# Altium footprint library Sajad_Altium_Library.PcbLib: 380 footprints (part 17 of 24)
Each footprint in its own frame and in the unit in brackets; x right, y up, seen from the top. Pads: shape width x height; smd on the part's side, far side on the other; paste and mask are expansions set on the pad; w line width, h text height; cw(c..) or ccw(c..) is an arc to the next point about the centre after c.
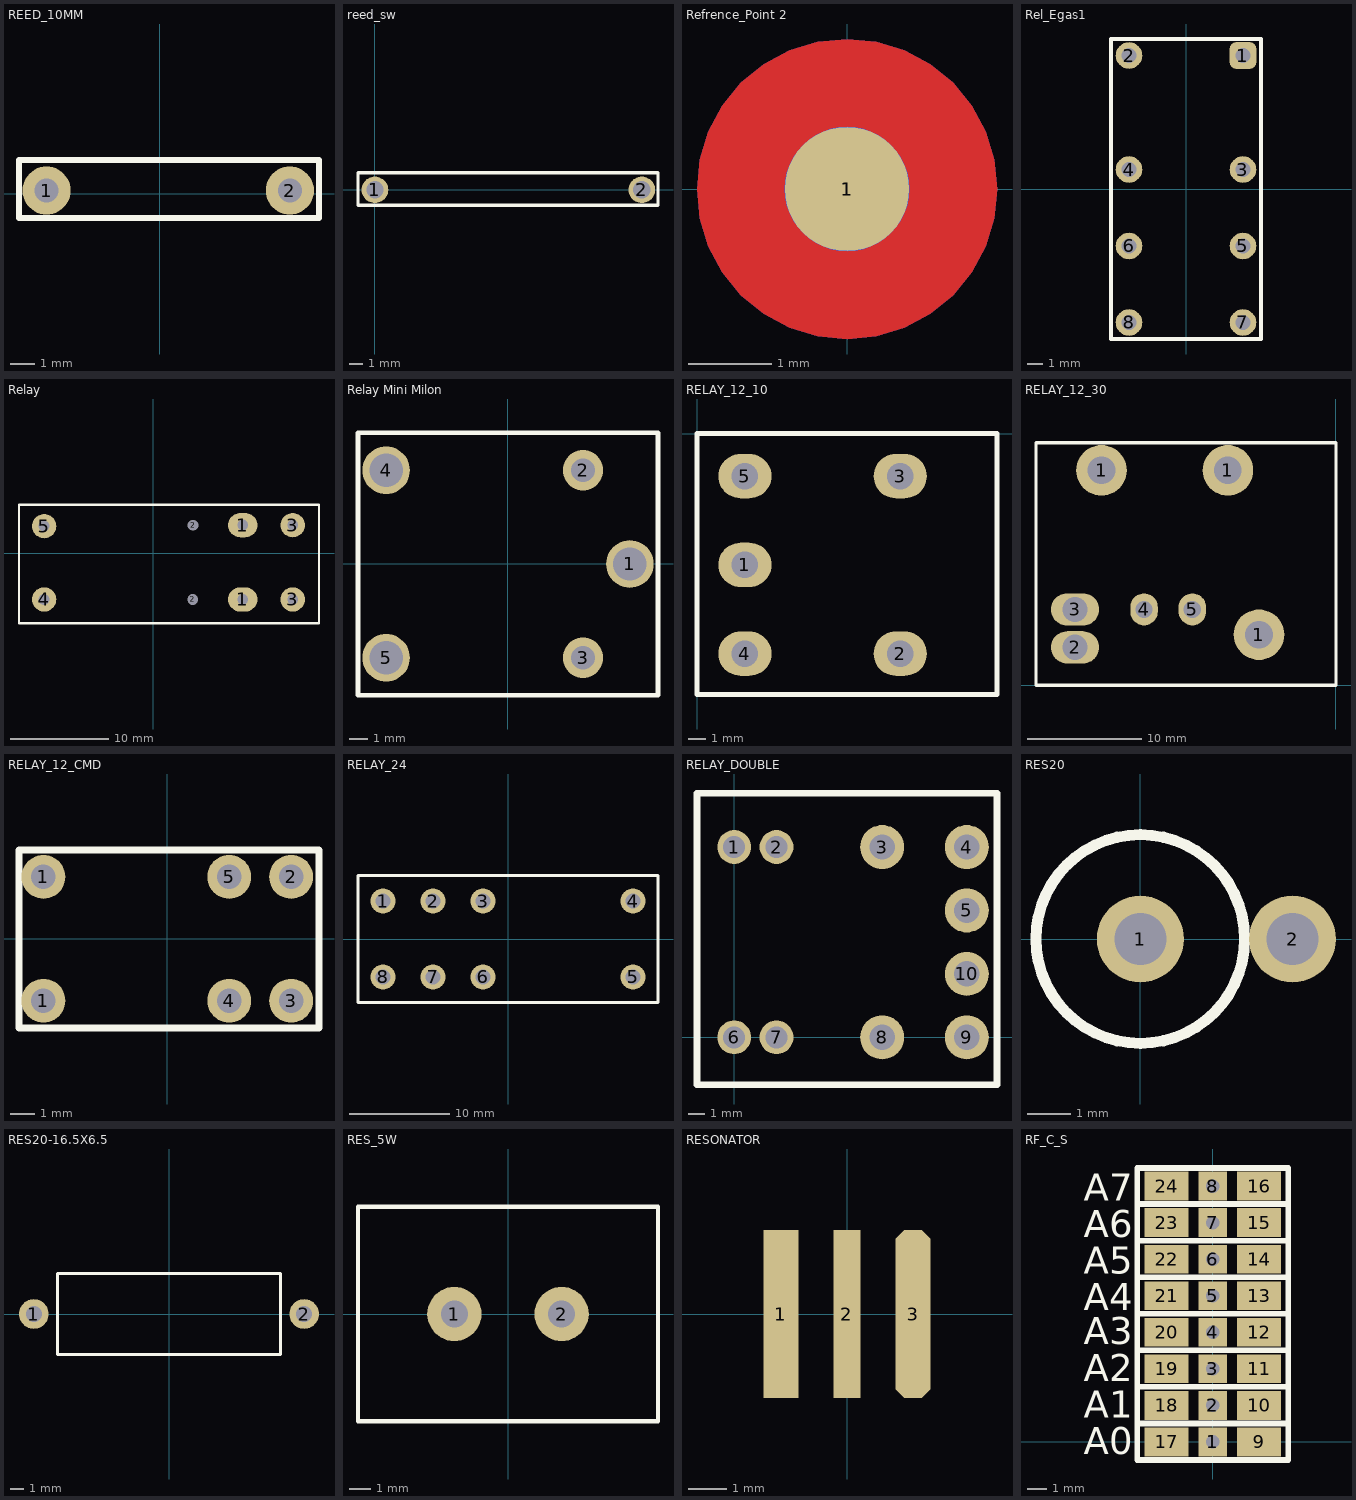
[diagram p16: the footprints below, top view; thin cyan lines are the x and y axes]

## REED_10MM [mm]
pads (2):
  round 2 hole 1: 1(-4.699,0.127) 2(5.395,0.127)
Top Overlay:
  lines w0.25: -5.842,-1.016 6.604,-1.016 6.604,1.397 -5.842,1.397 -5.842,-1.016

## reed_sw [mm]
pads (2):
  round 2 hole 1.3: 1(0,0) 2(20,0)
Top Overlay:
  lines w0.25: -1.27,-1.143 -1.27,1.27 21.209,1.27 21.209,-1.143 -1.27,-1.143

## Refrence_Point 2 [mm] "Refrence Point for Assembling Pcb"
pads (2):
  round 1.5 smd mask+1: 1(0,0)
  round 1.5 smd far side mask+1: 1(0,0)
Top Layer:
  pour cut-out: -1.809,0 -1.774,-0.353 -1.671,-0.692 -1.504,-1.005 -1.279,-1.279 -1.005,-1.504 -0.692,-1.671 -0.353,-1.774 0,-1.809 0.353,-1.774 0.692,-1.671 1.005,-1.504 1.279,-1.279 1.504,-1.005 1.671,-0.692 1.774,-0.353 1.809,0 1.774,0.353 1.671,0.692 1.504,1.005 1.279,1.279 1.005,1.504 0.692,1.671 0.353,1.774 0,1.809 -0.353,1.774 -0.692,1.671 -1.005,1.504 -1.279,1.279 -1.504,1.005 -1.671,0.692 -1.774,0.353
Bottom Layer:
  pour cut-out: -1.809,0 -1.774,-0.353 -1.671,-0.692 -1.504,-1.005 -1.279,-1.279 -1.005,-1.504 -0.692,-1.671 -0.353,-1.774 0,-1.809 0.353,-1.774 0.692,-1.671 1.005,-1.504 1.279,-1.279 1.504,-1.005 1.671,-0.692 1.774,-0.353 1.809,0 1.774,0.353 1.671,0.692 1.504,1.005 1.279,1.279 1.005,1.504 0.692,1.671 0.353,1.774 0,1.809 -0.353,1.774 -0.692,1.671 -1.005,1.504 -1.279,1.279 -1.504,1.005 -1.671,0.692 -1.774,0.353

## Rel_Egas1 [mil]
pads (8):
  rrect50% 70x70 hole 40: 1(149.61,350.39)
  round 70 hole 40: 2(-149.61,350.39) 3(149.61,51.18) 4(-149.61,51.18) 5(149.61,-149.61) 6(-149.61,-149.61) 7(149.61,-350.39) 8(-149.61,-350.39)
Top Overlay:
  lines w10: -196.85,-393.7 196.85,-393.7 196.85,393.7 -196.85,393.7 -196.85,-393.7

## Relay [mm]
pads (8):
  oval 3x2.5 hole 1.1: 1(9.124,-4.706) 1(9.124,2.894)
  round 1 hole 1.1: 2(4.024,-4.706) 2(4.048,2.886)
  round 2.5 hole 1.1: 3(14.224,-4.706) 3(14.224,2.894) 4(-11.176,-4.706) 5(-11.176,2.794)
Top Overlay:
  lines w0.254: -13.743,-7.112 -13.743,4.951 -13.741,4.953 16.916,4.953 16.916,-7.112 -13.743,-7.112

## Relay Mini Milon [mm]
pads (5):
  round 2.54 hole 1.778: 1(6.5,0) 4(-6.5,5) 5(-6.5,-5)
  round 2.159 hole 1.27: 2(4,5) 3(4,-5)
Top Overlay:
  lines w0.254: -8,-7 8,-7 8,7 -8,7 -8,-7

## RELAY_12_10 [mm] "RELAY_12_10"
pads (5):
  oval 3x2.5 hole 1.5: 1(2.7,-7.4) 2(11.45,-12.4) 3(11.45,-2.4) 4(2.7,-12.4) 5(2.7,-2.4)
Top Overlay:
  lines w0.3: 0,-14.7 0,0 16.9,0 16.9,-14.7 0,-14.7

## RELAY_12_30 [mm] "RELAY_12_30"
pads (7):
  round 4.4 hole 2.4: 1(-20.4,18.7) 1(-9.4,18.7) 1(-6.7,4.4)
  oval 4.2x2.8 hole 2.2: 2(-22.7,3.3) 3(-22.7,6.6)
  oval 2.4x2.8 hole 1.5: 4(-16.7,6.6) 5(-12.5,6.6)
Top Overlay:
  lines w0.3: -26.1,0 -26.1,21.1 0,21.1 0,0 -26.1,0

## RELAY_12_CMD [mm] "RELAY_12_CMD"
pads (6):
  round 1.8 hole 1: 1(-5.08,2.54) 1(-5.08,-2.54) 2(5.08,2.54) 3(5.08,-2.54) 4(2.54,-2.54) 5(2.54,2.54)
Top Overlay:
  lines w0.3: -6.08,-3.66 6.22,-3.66 6.22,3.64 -6.08,3.64 -6.08,-3.66

## RELAY_24 [mm] "RELAY_24"
pads (8):
  round 2.5 hole 1.5: 1(-12.5,3.8) 2(-7.5,3.8) 3(-2.5,3.8) 4(12.5,3.8) 5(12.5,-3.8) 6(-2.5,-3.8) 7(-7.5,-3.8) 8(-12.5,-3.8)
Top Overlay:
  lines w0.3: -15,-6.35 15,-6.35 15,6.35 -15,6.35 -15,-6.35

## RELAY_DOUBLE [mm] "JQC-16F"
pads (10):
  round 2 hole 1.3: 1(0,11.25) 2(2.5,11.25) 6(0,0) 7(2.5,0)
  round 2.6 hole 1.5: 3(8.75,11.25) 4(13.75,11.25) 5(13.75,7.5) 8(8.75,0) 9(13.75,0) 10(13.75,3.75)
Top Overlay:
  lines w0.4: -2.2,-2.8 15.535,-2.8 15.535,14.425 -2.2,14.425 -2.2,-2.8
3D body: height 13, standoff 0, extent -1.994,-2.649 15.506,14.351

## RES20 [mm] "Resistor, Axial; Body 16.5 x 6.5 mm (LxDia. max), Lead Dia. 0.85 mm (max)"
height 6.5
pads (2):
  round 2 hole 1.2: 1(0,0) 2(3.5,0)
Top Overlay:
  circle w0.254: c0,0 r2.4
3D body: height 7.62, standoff -1.91, extent -1.206,-1.27 2.73,1.016

## RES20-16.5X6.5 [mm] "Resistor, Axial; Body 16.5 x 6.5 mm (LxDia. max), Lead Dia. 0.85 mm (max)"
height 6.5
pads (2):
  round 2.2 hole 1.2: 1(-10,0) 2(10,0)
Top Overlay:
  lines w0.2: -8.25,-3 8.25,-3 8.25,3 -8.25,3 -8.25,-3
3D body: height 8.3, standoff -2, extent -11.1,-3.175 11.1,3.425

## RES_5W [mm]
height 6.5
pads (2):
  round 2.54 hole 1.27: 1(-2.5,0) 2(2.5,0)
Top Overlay:
  lines w0.2: -7,-5 -7,5 7,5 7,-5 -7,-5

## RESONATOR [mm]
height 1.76
pads (3):
  rect 0.9x4.318 smd: 1(-1.7,0)
  rect 0.7x4.318 smd: 2(0,0)
  oct 0.9x4.318 smd: 3(1.7,0)

## RF_C_S [mm]
pads (24):
  rect 1.5x1.5 hole 0.7: 1(0,0) 2(0,1.905) 3(0,3.81) 4(0,5.715) 5(0,7.62) 6(0,9.525) 7(0,11.43) 8(0,13.335)
  rect 2.3x1.5 smd: 9(2.413,0) 10(2.413,1.905) 11(2.413,3.81) 12(2.413,5.715) 13(2.413,7.62) 14(2.413,9.525) 15(2.413,11.43) 16(2.413,13.335) 17(-2.413,0) 18(-2.413,1.905) 19(-2.413,3.81) 20(-2.413,5.715) 21(-2.413,7.62) 22(-2.413,9.525) 23(-2.413,11.43) 24(-2.413,13.335)
Top Overlay:
  lines w0.3: -3.937,0.965 3.937,0.965 ; -3.937,2.87 3.937,2.87 ; -3.937,4.775 3.937,4.775 ; -3.937,6.68 3.937,6.68 ; -3.937,8.585 3.937,8.585 ; -3.937,10.49 3.937,10.49 ; -3.937,12.395 3.937,12.395 ; -3.937,-0.94 3.937,-0.94 3.937,14.275 -3.937,14.275 -3.937,-0.94
  text "A7" at -6.731,12.573 h1.4
  text "A6" at -6.731,10.668 h1.4
  text "A5" at -6.731,8.763 h1.4
  text "A4" at -6.731,6.858 h1.4
  text "A3" at -6.731,5.08 h1.4
  text "A2" at -6.731,3.175 h1.4
  text "A1" at -6.731,1.27 h1.4
  text "A0" at -6.731,-0.635 h1.4